# Altium footprint library hphonglib.PcbLib: 1250 footprints (part 63 of 79)
Each footprint in its own frame and in the unit in brackets; x right, y up, seen from the top. Pads: shape width x height; smd on the part's side, far side on the other; paste and mask are expansions set on the pad; w line width, h text height; cw(c..) or ccw(c..) is an arc to the next point about the centre after c.
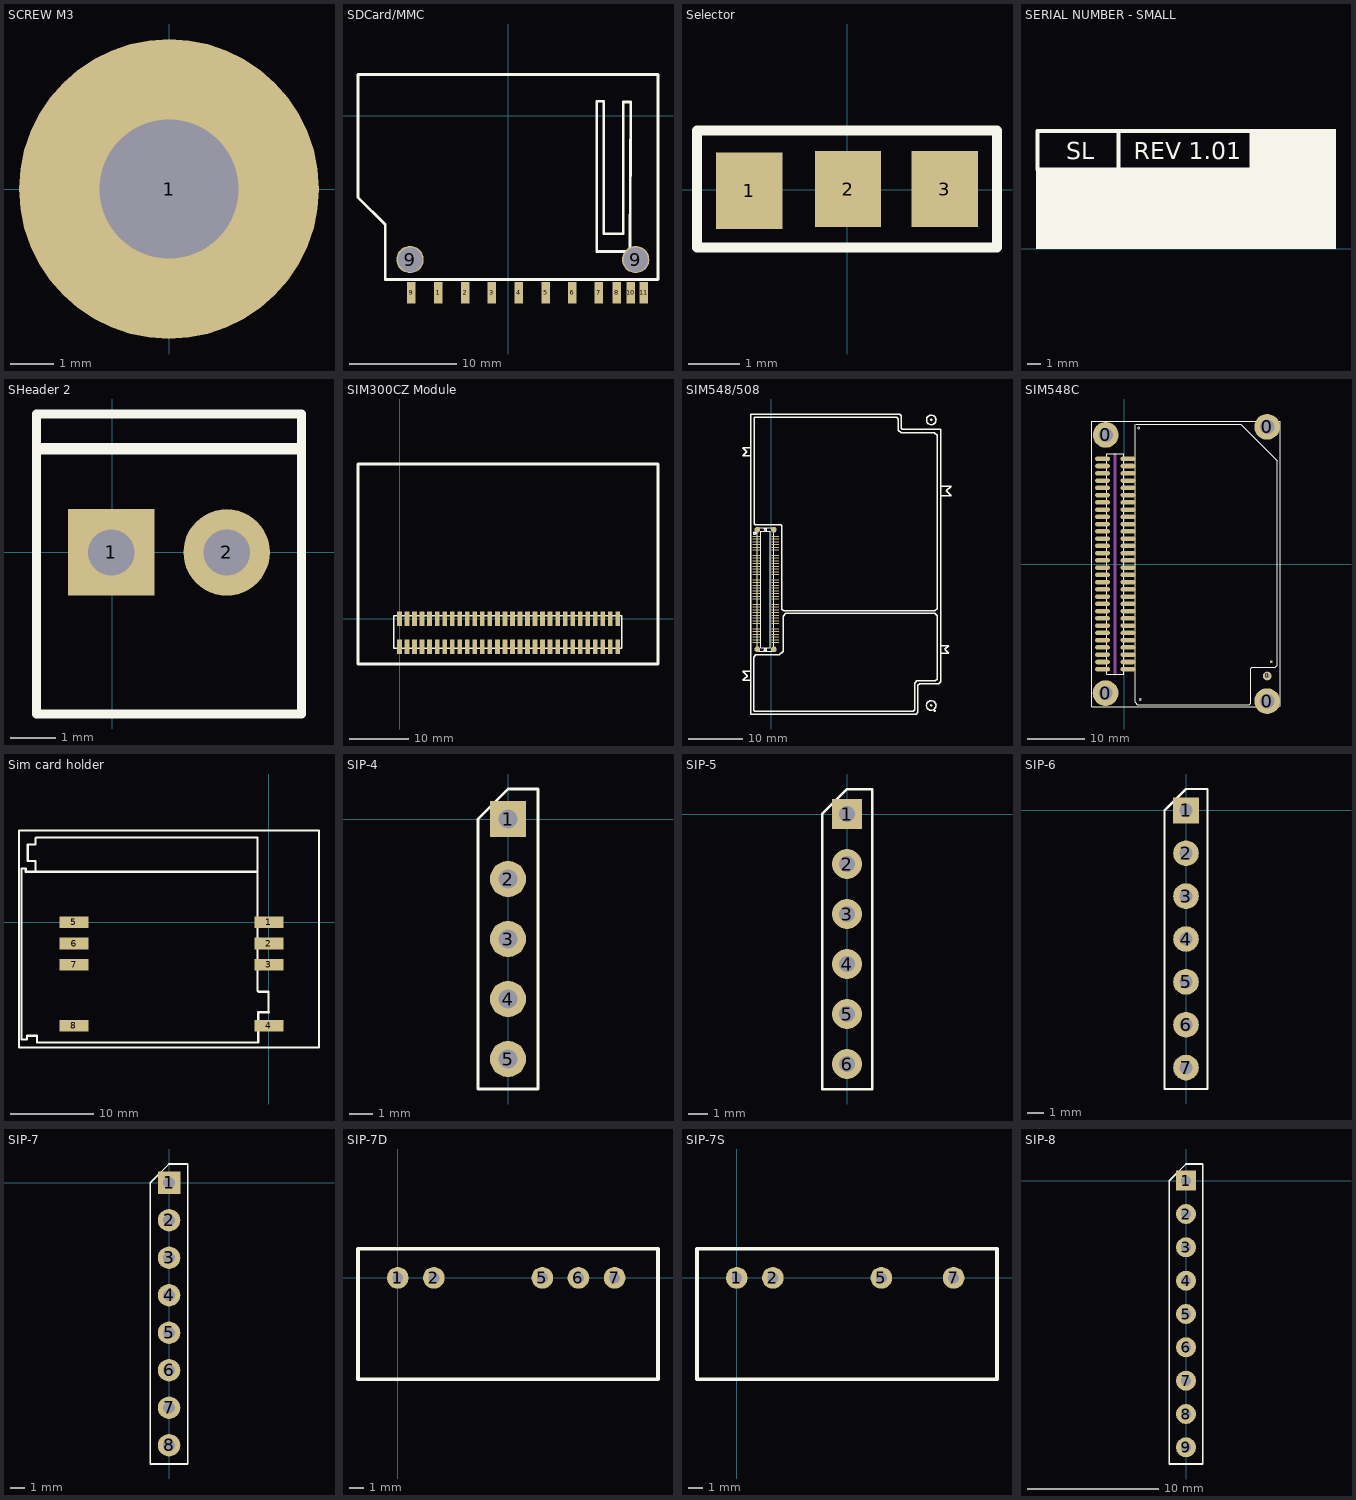
[diagram p62: the footprints below, top view; thin cyan lines are the x and y axes]

## SCREW M3 [mil] "Hole Screw"
pads (1):
  round 270 hole 125: 1(0,0)

## SDCard/MMC [mil]
pads (13):
  rect 31x79 smd: 1(-256,-650) 2(-157,-650) 3(-59,-650) 4(39,-650) 5(138,-650) 6(236,-650) 7(332,-650) 8(399,-650) 9(-354,-650) 10(450,-650) 11(497,-650)
  round 100 hole 90: 9(-359,-528) 9(468,-528)
Top Overlay:
  lines w10: -548,151 -550,151 ; -550,151 -118,151 550,151 550,-601 -447,-601 -450,-601 -450,-399 -550,-300 -550,151 ; 325,-498 337,-498 447,-498 450,50 423,50 423,-433 351,-433 351,53 325,53 325,-498

## Selector [mm]
pads (3):
  rect 1.3x1.5 smd: 1(-1.921,-0.018) 2(0.021,0.018) 3(1.921,0.018)
Top Overlay:
  lines w0.2: -2.946,1.157 -2.946,-1.132 2.915,-1.132 ; -2.946,1.168 2.94,1.168 ; 2.946,-1.132 2.946,1.168

## SERIAL NUMBER - SMALL [mm]
Top Overlay:
  rectangle: 19.052,-0.01 25.402,9.007
  rectangle: 2.807,-0.01 19.19,6.117
  lines w0.3: 9.019,5.959 9.019,8.88 ; 2.923,5.959 19.052,5.959 19.052,8.88 2.923,8.88 2.923,5.959
  text "REV 1.01" at 10.162,6.721 h1.3
  text "SL" at 5.082,6.721 h1.3

## SHeader 2 [mil] "Connector; Header; Signal; 2 Positions; Solder Pad 35mil"
pads (2):
  rect 75x75 hole 40: 1(-1,0)
  round 75 hole 40: 2(99,0)
Top Overlay:
  lines w7.87: -66,-140 -66,120 164,120 164,-140 -66,-140
  lines w10: -61,90 159,90

## SIM300CZ Module [mm] "GSM Module"
pads (60):
  rect 0.8x2.4 smd: 1(0,-4.7) 2(0,0) 3(1.27,-4.7) 4(1.27,0) 5(2.54,-4.7) 6(2.54,0) 7(3.81,-4.7) 8(3.81,0) 9(5.08,-4.7) 10(5.08,0) 11(6.35,-4.7) 12(6.35,0) 13(7.62,-4.7) 14(7.62,0) 15(8.89,-4.7) 16(8.89,0) 17(10.16,-4.7) 18(10.16,0) 19(11.43,-4.7) 20(11.43,0) 21(12.7,-4.7) 22(12.7,0) 23(13.97,-4.7) 24(13.97,0) 25(15.24,-4.7) 26(15.24,0) 27(16.51,-4.7) 28(16.51,0) 29(17.78,-4.7) 30(17.78,0) 31(19.05,-4.7) 32(19.05,0) 33(20.32,-4.7) 34(20.32,0) 35(21.59,-4.7) 36(21.59,0) 37(22.86,-4.7) 38(22.86,0) 39(24.13,-4.7) 40(24.13,0) 41(25.4,-4.7) 42(25.4,0) 43(26.67,-4.7) 44(26.67,0) 45(27.94,-4.7) 46(27.94,0) 47(29.21,-4.7) 48(29.21,0) 49(30.48,-4.7) 50(30.48,0) 51(31.75,-4.7) 52(31.75,0) 53(33.02,-4.7) 54(33.02,0) 55(34.29,-4.7) 56(34.29,0) 57(35.56,-4.7) 58(35.56,0) 59(36.83,-4.7) 60(36.83,0)
Top Overlay:
  lines w0.254: -1,-5 37.5,-5 37.5,0.5 -1,0.5 -1,-5
  lines w0.508: 5.3,26.1 8.9,26.1 ; 8.9,26.1 43.6,26.1 43.6,-7.6 22.3,-7.6 -1.9,-7.6 -7,-7.6 -7,26.1 8.9,26.1
3D body: height 4.01, standoff 3.9, extent 36.33,-3.762 37.33,-2.7
3D body: height 4.01, standoff 3.9, extent 36.33,-2 37.33,-0.938
3D body: height 4.01, standoff 3.9, extent 35.06,-2 36.06,-0.938
3D body: height 4.01, standoff 3.9, extent 35.06,-3.762 36.06,-2.7
3D body: height 4.01, standoff 3.9, extent 33.79,-2 34.79,-0.938
3D body: height 4.01, standoff 3.9, extent 33.79,-3.762 34.79,-2.7
3D body: height 4.01, standoff 3.9, extent 32.52,-3.762 33.52,-2.7
3D body: height 4.01, standoff 3.9, extent 32.52,-2 33.52,-0.938
3D body: height 4.01, standoff 3.9, extent 31.25,-2 32.25,-0.938
3D body: height 4.01, standoff 3.9, extent 31.25,-3.762 32.25,-2.7
3D body: height 4.01, standoff 3.9, extent 29.98,-2 30.98,-0.938
3D body: height 4.01, standoff 3.9, extent 29.98,-3.762 30.98,-2.7
3D body: height 4.01, standoff 3.9, extent 28.71,-3.762 29.71,-2.7
3D body: height 4.01, standoff 3.9, extent 28.71,-2 29.71,-0.938
3D body: height 4.01, standoff 3.9, extent 27.44,-2 28.44,-0.938
3D body: height 4.01, standoff 3.9, extent 27.44,-3.762 28.44,-2.7
3D body: height 4.01, standoff 3.9, extent 26.17,-2 27.17,-0.938
3D body: height 4.01, standoff 3.9, extent 26.17,-3.762 27.17,-2.7
3D body: height 4.01, standoff 3.9, extent 24.9,-3.762 25.9,-2.7
3D body: height 4.01, standoff 3.9, extent 24.9,-2 25.9,-0.938
3D body: height 4.01, standoff 3.9, extent 23.63,-2 24.63,-0.938
3D body: height 4.01, standoff 3.9, extent 23.63,-3.762 24.63,-2.7
3D body: height 4.01, standoff 3.9, extent 22.36,-2 23.36,-0.938
3D body: height 4.01, standoff 3.9, extent 22.36,-3.762 23.36,-2.7
3D body: height 4.01, standoff 3.9, extent 21.09,-3.762 22.09,-2.7
3D body: height 4.01, standoff 3.9, extent 21.09,-2 22.09,-0.938
3D body: height 4.01, standoff 3.9, extent 19.82,-2 20.82,-0.938
3D body: height 4.01, standoff 3.9, extent 19.82,-3.762 20.82,-2.7
3D body: height 4.01, standoff 3.9, extent 18.55,-2 19.55,-0.938
3D body: height 4.01, standoff 3.9, extent 18.55,-3.762 19.55,-2.7
3D body: height 4.01, standoff 3.9, extent 17.28,-3.762 18.28,-2.7
3D body: height 4.01, standoff 3.9, extent 17.28,-2 18.28,-0.938
3D body: height 4.01, standoff 3.9, extent 16.01,-2 17.01,-0.938
3D body: height 4.01, standoff 3.9, extent 16.01,-3.762 17.01,-2.7
3D body: height 4.01, standoff 3.9, extent 14.74,-2 15.74,-0.938
3D body: height 4.01, standoff 3.9, extent 14.74,-3.762 15.74,-2.7
3D body: height 4.01, standoff 3.9, extent 13.47,-3.762 14.47,-2.7
3D body: height 4.01, standoff 3.9, extent 13.47,-2 14.47,-0.938
3D body: height 4.01, standoff 3.9, extent 12.2,-2 13.2,-0.938
3D body: height 4.01, standoff 3.9, extent 12.2,-3.762 13.2,-2.7
3D body: height 4.01, standoff 3.9, extent 10.93,-2 11.93,-0.938
3D body: height 4.01, standoff 3.9, extent 10.93,-3.762 11.93,-2.7
3D body: height 4.01, standoff 3.9, extent 9.66,-3.762 10.66,-2.7
3D body: height 4.01, standoff 3.9, extent 9.66,-2 10.66,-0.938
3D body: height 4.01, standoff 3.9, extent 8.39,-2 9.39,-0.938
3D body: height 4.01, standoff 3.9, extent 8.39,-3.762 9.39,-2.7
3D body: height 4.01, standoff 3.9, extent 7.12,-2 8.12,-0.938
3D body: height 4.01, standoff 3.9, extent 7.12,-3.762 8.12,-2.7
3D body: height 4.01, standoff 3.9, extent 5.85,-3.762 6.85,-2.7
3D body: height 4.01, standoff 3.9, extent 5.85,-2 6.85,-0.938
3D body: height 4.01, standoff 3.9, extent -0.5,-2 0.5,-0.938
3D body: height 4, standoff 0.1, extent -0.9,-4.975 37.55,0.5
3D body: height 4.01, standoff 3.9, extent -0.5,-3.762 0.5,-2.7
3D body: height 4.01, standoff 3.9, extent 0.77,-3.762 1.77,-2.7
3D body: height 4.01, standoff 3.9, extent 0.77,-2 1.77,-0.938
3D body: height 4.01, standoff 3.9, extent 2.04,-3.762 3.04,-2.7
3D body: height 4.01, standoff 3.9, extent 2.04,-2 3.04,-0.938
3D body: height 4.01, standoff 3.9, extent 3.31,-3.762 4.31,-2.7
3D body: height 4.01, standoff 3.9, extent 3.31,-2 4.31,-0.938
3D body: height 4.01, standoff 3.9, extent 4.58,-3.762 5.58,-2.7
3D body: height 4.01, standoff 3.9, extent 4.58,-2 5.58,-0.938

## SIM548/508 [mm] "SIM508/548-80PIN"
pads (84):
  oct 1x1 smd: 0(-2.5,96) 0(-2.5,118) 0(0.5,96) 0(0.5,118)
  oct 1.4x0.17 smd: 1(-2.75,116.75) 2(0.75,116.75) 3(-2.75,116.25) 4(0.75,116.25) 5(-2.75,115.75) 6(0.75,115.75) 7(-2.75,115.25) 8(0.75,115.25) 9(-2.75,114.75) 10(0.75,114.75) 11(-2.75,114.25) 12(0.75,114.25) 13(-2.75,113.75) 14(0.75,113.75) 15(-2.75,113.25) 16(0.75,113.25) 17(-2.75,112.75) 18(0.75,112.75) 19(-2.75,112.25) 20(0.75,112.25) 21(-2.75,111.75) 22(0.75,111.75) 23(-2.75,111.25) 24(0.75,111.25) 25(-2.75,110.75) 26(0.75,110.75) 27(-2.75,110.25) 28(0.75,110.25) 29(-2.75,109.75) 30(0.75,109.75) 31(-2.75,109.25) 32(0.75,109.25) 33(-2.75,108.75) 34(0.75,108.75) 35(-2.75,108.25) 36(0.75,108.25) 37(-2.75,107.75) 38(0.75,107.75) 39(-2.75,107.25) 40(0.75,107.25) 41(-2.75,106.75) 42(0.75,106.75) 43(-2.75,106.25) 44(0.75,106.25) 45(-2.75,105.75) 46(0.75,105.75) 47(-2.75,105.25) 48(0.75,105.25) 49(-2.75,104.75) 50(0.75,104.75) 51(-2.75,104.25) 52(0.75,104.25) 53(-2.75,103.75) 54(0.75,103.75) 55(-2.75,103.25) 56(0.75,103.25) 57(-2.75,102.75) 58(0.75,102.75) 59(-2.75,102.25) 60(0.75,102.25) 61(-2.75,101.75) 62(0.75,101.75) 63(-2.75,101.25) 64(0.75,101.25) 65(-2.75,100.75) 66(0.75,100.75) 67(-2.75,100.25) 68(0.75,100.25) 69(-2.75,99.75) 70(0.75,99.75) 71(-2.75,99.25) 72(0.75,99.25) 73(-2.75,98.75) 74(0.75,98.75) 75(-2.75,98.25) 76(0.75,98.25) 77(-2.75,97.75) 78(0.75,97.75) 79(-2.75,97.25) 80(0.75,97.25)
Top Overlay:
  circle w0.254: c-3.014,117.35 r0.204
  circle w0.254: c29.424,85.7 r0.876
  circle w0.254: c29.434,138.15 r0.876
  circle w0.254: c29.42,138.21 r0.1
  circle w0.254: c29.4,85.7 r0.1
  circle w0.254: c30.1,84.7 r0.1
  rectangle: -1.25,118 -0.75,118.31
  rectangle: -1.245,95.681 -0.745,96.005
  lines w0.05: -1.25,118.086 -1.25,118.31 ; -1.25,118.105 ccw(c-1,118.105) -0.75,118.105 -0.75,118.3 ; -1.246,95.705 -1.246,95.9 cw(c-0.996,95.9) -0.746,95.9 -0.746,95.676
  lines w0.17: -2.5,95.625 -2.5,118.375 0.5,118.375 0.5,95.625 -2.5,95.625 ; -1.85,96.325 -0.15,96.325 -0.15,117.675 -1.85,117.675 -1.85,96.325
  lines w0.254: -3.72,90.3 -5.2,90.3 -5,90.5 -4.9,90.6 -4.4,91.1 -4.4,91.2 -5.2,92 -3.7,92 ; -3.72,131.6 -5.2,131.6 -4.5,132.3 ; -3.72,133 -5.2,133 -4.5,132.3 ; 2.2,102 2.2,102.1 ; 31.17,95.3 32.6,95.3 31.9,96 ; 31.17,96.7 32.6,96.7 31.9,96 ; 31.17,124.2 33.1,124.2 32.2,125.1 ; 31.17,126 33.1,126 32.2,125.1 ; -4.5,132.3 -4.5,132.3 ; 2.2,102.1 2.7,102.6 30.1,102.6 30.5,102.2 30.5,90.5 30.2,90.2 26.8,90.2 26.4,89.8 26.4,84.9 26.1,84.6 -3,84.6 -3.2,84.8 -3.2,94.6 -2.8,95 1.5,95 2.2,95.7 2.2,102.1 ; 31.9,96 31.9,96 ; 32.2,125.1 32.2,125.1 ; -3.72,84.13 26.63,84.13 26.97,84.47 26.97,89.37 27.3,89.7 30.8,89.7 31.17,90.07 31.17,97.42 31.17,136.4 31.14,136.43 24.13,136.43 23.94,136.62 23.94,137.1 23.94,138.96 23.66,139.24 -3.72,139.24 -3.72,84.13 ; -3.1,119.1 -2.9,118.9 1.8,118.9 2,118.7 2,103.4 2.3,103.1 3,103.1 30.1,103.1 30.5,103.5 30.5,119.7 30.5,135.3 30,135.8 23.9,135.8 23.4,136.3 23.4,138.3 23.1,138.6 -3.1,138.6 -3.1,119.1
3D body: height 1.6, standoff 0, extent -2.575,95.545 0.575,118.46
3D body: height 0, standoff 0, extent -3.218,117.146 -2.811,117.554
3D body: height 1, standoff 0, extent 28.42,137.155 30.43,139.155
3D body: height 1, standoff 0, extent 28.43,84.7 30.44,86.7
3D body: height 1, standoff 0, extent 29.195,137.975 29.655,138.435
3D body: height 1, standoff 0, extent 29.17,85.47 29.63,85.93
3D body: height 1, standoff 0, extent 31.191,124.211 33.068,126.077
3D body: height 1, standoff 0, extent 31.192,95.333 32.554,96.719
3D body: height 1, standoff 0, extent -5.134,90.273 -3.75,92.031
3D body: height 1, standoff 0, extent -5.167,131.572 -3.77,133.027

## SIM548C [mm] "SIM548C-60PIN"
pads (68):
  round 4.5 hole 2.5: 0(-3.28,-22.59) 0(-3.25,22.59) 0(25,-24) 0(25,24)
  round 0.5 hole 0.3: 0(2.5,23.8) 0(2.8,-23.7) 0(25.7,-17.1)
  round 1.524 hole 0.762: 0(25,-19.6)
  oval 2.6x0.8 smd: 1(-3.81,18.415) 2(0.635,18.415) 3(-3.81,17.145) 4(0.635,17.145) 5(-3.81,15.875) 6(0.635,15.875) 7(-3.81,14.605) 8(0.635,14.605) 9(-3.81,13.335) 10(0.635,13.335) 11(-3.81,12.065) 12(0.635,12.065) 13(-3.81,10.795) 14(0.635,10.795) 15(-3.81,9.525) 16(0.635,9.525) 17(-3.81,8.255) 18(0.635,8.255) 19(-3.81,6.985) 20(0.635,6.985) 21(-3.81,5.715) 22(0.635,5.715) 23(-3.81,4.445) 24(0.635,4.445) 25(-3.81,3.175) 26(0.635,3.175) 27(-3.81,1.905) 28(0.635,1.905) 29(-3.81,0.635) 30(0.635,0.635) 31(-3.81,-0.635) 32(0.635,-0.635) 33(-3.81,-1.905) 34(0.635,-1.905) 35(-3.81,-3.175) 36(0.635,-3.175) 37(-3.81,-4.445) 38(0.635,-4.445) 39(-3.81,-5.715) 40(0.635,-5.715) 41(-3.81,-6.985) 42(0.635,-6.985) 43(-3.81,-8.255) 44(0.635,-8.255) 45(-3.81,-9.525) 46(0.635,-9.525) 47(-3.81,-10.795) 48(0.635,-10.795) 49(-3.81,-12.065) 50(0.635,-12.065) 51(-3.81,-13.335) 52(0.635,-13.335) 53(-3.81,-14.605) 54(0.635,-14.605) 55(-3.81,-15.875) 56(0.635,-15.875) 57(-3.81,-17.145) 58(0.635,-17.145) 59(-3.81,-18.415) 60(0.635,-18.415)
Top Overlay:
  lines w0.17: 1.9,24.5 1.9,-24.2 2.3,-24.6 21.9,-24.6 22.1,-24.4 22.1,-18.3 22.3,-18.1 26.4,-18.1 26.8,-17.7 26.8,18.1 20.4,24.5 2.1,24.5 ; -5.715,-25 -5.715,25 27.305,25 27.305,-24.765 27.07,-25 -5.715,-25 ; -3.095,-19.265 -3.095,19.265 -2.345,19.265 -0.845,19.265 -0.075,19.265 -0.075,-19.265 -3.095,-19.265
Mechanical 1:
  lines w0.508: -1.6,-19.3 -1.6,19.2
3D body: height 3.5, standoff 0, extent -2.6,4.1 -1.9,4.9
3D body: height 3.5, standoff 0, extent -2.6,5.3 -1.9,6.1
3D body: height 3.5, standoff 0, extent -2.6,6.6 -1.9,7.4
3D body: height 3.5, standoff 0, extent -2.6,2.8 -1.9,3.6
3D body: height 3.5, standoff 0, extent -2.6,1.5 -1.9,2.3
3D body: height 3.5, standoff 0, extent -2.6,0.3 -1.9,1.1
3D body: height 3.5, standoff 0, extent -2.6,-1.1 -1.9,-0.3
3D body: height 3.5, standoff 0, extent -2.6,-2.4 -1.9,-1.6
3D body: height 3.5, standoff 0, extent -2.6,-3.6 -1.9,-2.8
3D body: height 3.5, standoff 0, extent -2.6,-4.9 -1.9,-4.1
3D body: height 3.5, standoff 0, extent -2.65,-6.2 -1.95,-5.4
3D body: height 3.5, standoff 0, extent -2.6,-7.4 -1.9,-6.6
3D body: height 3.5, standoff 0, extent -2.6,-8.7 -1.9,-7.9
3D body: height 3.5, standoff 0, extent -2.6,-10 -1.9,-9.2
3D body: height 3.5, standoff 0, extent -2.6,-11.2 -1.9,-10.4
3D body: height 3.5, standoff 0, extent -2.6,-12.5 -1.9,-11.7
3D body: height 3.5, standoff 0, extent -2.6,-13.8 -1.9,-13
3D body: height 3.5, standoff 0, extent -2.6,-15 -1.9,-14.2
3D body: height 3.5, standoff 0, extent -2.6,-16.3 -1.9,-15.5
3D body: height 3.5, standoff 0, extent -2.6,-17.6 -1.9,-16.8
3D body: height 3.5, standoff 0, extent -2.6,-18.8 -1.9,-18
3D body: height 3.5, standoff 0, extent -1.3,-16.3 -0.6,-15.5
3D body: height 3.5, standoff 0, extent -1.3,-17.6 -0.6,-16.8
3D body: height 3.5, standoff 0, extent -1.3,-18.8 -0.6,-18
3D body: height 3.5, standoff 0, extent -1.3,-12.5 -0.6,-11.7
3D body: height 3.5, standoff 0, extent -1.3,-13.8 -0.6,-13
3D body: height 3.5, standoff 0, extent -1.3,-15 -0.6,-14.2
3D body: height 3.5, standoff 0, extent -1.3,-8.7 -0.6,-7.9
3D body: height 3.5, standoff 0, extent -1.3,-10 -0.6,-9.2
3D body: height 3.5, standoff 0, extent -1.3,-11.2 -0.6,-10.4
3D body: height 3.5, standoff 0, extent -1.3,-4.9 -0.6,-4.1
3D body: height 3.5, standoff 0, extent -1.3,-6.2 -0.6,-5.4
3D body: height 3.5, standoff 0, extent -1.3,-7.4 -0.6,-6.6
3D body: height 3.5, standoff 0, extent -1.3,-1.1 -0.6,-0.3
3D body: height 3.5, standoff 0, extent -1.3,-2.4 -0.6,-1.6
3D body: height 3.5, standoff 0, extent -1.3,-3.6 -0.6,-2.8
3D body: height 3.5, standoff 0, extent -1.3,2.8 -0.6,3.6
3D body: height 3.5, standoff 0, extent -1.3,1.5 -0.6,2.3
3D body: height 3.5, standoff 0, extent -1.3,0.3 -0.6,1.1
3D body: height 3.5, standoff 0, extent -1.3,6.6 -0.6,7.4
3D body: height 3.5, standoff 0, extent -1.3,5.3 -0.6,6.1
3D body: height 3.5, standoff 0, extent -1.3,4.1 -0.6,4.9
3D body: height 3.5, standoff 0, extent -1.3,10.4 -0.6,11.2
3D body: height 3.5, standoff 0, extent -1.3,9.1 -0.6,9.9
3D body: height 3.5, standoff 0, extent -1.3,7.9 -0.6,8.7
3D body: height 3.5, standoff 0, extent -1.3,11.7 -0.6,12.5
3D body: height 3.5, standoff 0, extent -1.3,12.9 -0.6,13.7
3D body: height 3.5, standoff 0, extent -1.3,14.2 -0.6,15
3D body: height 3.5, standoff 0, extent -1.3,15.5 -0.6,16.3
3D body: height 3.5, standoff 0, extent -1.3,16.7 -0.6,17.5
3D body: height 3.5, standoff 0, extent -2.6,7.8 -1.9,8.6
3D body: height 3.5, standoff 0, extent -2.6,9.1 -1.9,9.9
3D body: height 3.5, standoff 0, extent -2.6,10.4 -1.9,11.2
3D body: height 3.5, standoff 0, extent -2.6,11.7 -1.9,12.5
3D body: height 3.5, standoff 0, extent -2.6,12.9 -1.9,13.7
3D body: height 3.5, standoff 0, extent -2.6,14.2 -1.9,15
3D body: height 3.5, standoff 0, extent -2.6,15.5 -1.9,16.3
3D body: height 3.5, standoff 0, extent -2.6,16.7 -1.9,17.5
3D body: height 3.5, standoff 0, extent -2.6,18 -1.9,18.8
3D body: height 3.5, standoff 0, extent -1.3,18 -0.6,18.8
3D body: height 3.5, standoff 0, extent -3.1,-19.3 -0.1,19.2

## Sim card holder [mm]
pads (8):
  rect 3.5x1.4 smd: 1(0,0) 2(0,-2.54) 3(0,-5.08) 4(0,-12.4) 5(-23.4,0) 6(-23.4,-2.54) 7(-23.4,-5.08) 8(-23.4,-12.4)
Top Overlay:
  lines w0.254: -29.718,-14.072 -29.718,-12.395 ; -29.718,-12.522 -29.718,6.452 -29.185,6.452 -29.185,6.071 -28.016,6.071 -28.016,7.366 -28.956,7.366 -28.956,9.322 -28.042,9.322 -28.042,10.058 -27.94,10.16 -1.397,10.16 -1.397,6.071 -27.965,6.071 ; -29.667,-14.072 -29.058,-14.072 -29.032,-14.046 -29.032,-13.614 -27.864,-13.614 ; -27.838,-13.64 -27.838,-14.427 -1.295,-14.427 -1.295,-10.795 -0.025,-10.795 -0.051,-10.77 -0.051,-8.306 -0.076,-8.331 -1.27,-8.331 -1.397,-8.204 -1.397,6.045 ; -24.9,-15 4,-15 5,-15 6,-15 6,5 6,10 6,11 -30,11 -30,5 -30,-15 -29,-15 -28,-15 -24,-15
3D body "SIMLOCK-1.STEP": height 2.5, standoff 0, extent -24.92,-9.895 5.08,7.405

## SIP-4 [mil]
pads (5):
  rect 60x60 hole 31.49 unplated: 1(0,0)
  round 60 hole 31.49 unplated: 2(0,-100) 3(0,-200) 4(0,-300) 5(0,-400)
Top Overlay:
  lines w5: -50,-450 50,-450 50,50 0,50 -50,0 -50,-450

## SIP-5 [mil]
pads (6):
  rect 60x60 hole 31.49 unplated: 1(0,0)
  round 60 hole 31.49 unplated: 2(0,-100) 3(0,-200) 4(0,-300) 5(0,-400) 6(0,-500)
Top Overlay:
  lines w5: -50,-550 50,-550 50,50 0,50 -50,0 -50,-550

## SIP-6 [mil]
pads (7):
  rect 60x60 hole 31.49 unplated: 1(0,0)
  round 60 hole 31.49 unplated: 2(0,-100) 3(0,-200) 4(0,-300) 5(0,-400) 6(0,-500) 7(0,-600)
Top Overlay:
  lines w5: -50,-650 50,-650 50,50 0,50 -50,0 -50,-650

## SIP-7 [mil]
pads (8):
  rect 60x60 hole 31.49 unplated: 1(0,0)
  round 60 hole 31.49 unplated: 2(0,-100) 3(0,-200) 4(0,-300) 5(0,-400) 6(0,-500) 7(0,-600) 8(0,-700)
Top Overlay:
  lines w5: -50,-750 -50,0 0,50 50,50 50,-750 -50,-750

## SIP-7D [mil] "Industry Standard SIP-7 Dual"
pads (5):
  round 60 hole 30: 1(0,0) 2(100,0) 5(400,0) 6(500,0) 7(600,0)
Top Overlay:
  lines w10: -110,-280 -110,80 720,80 720,-280 -110,-280

## SIP-7S [mil] "Industry Standard SIP-7 Single"
pads (4):
  round 60 hole 30: 1(0,0) 2(100,0) 5(400,0) 7(600,0)
Top Overlay:
  lines w10: -110,-280 -110,80 720,80 720,-280 -110,-280

## SIP-8 [mil]
pads (9):
  rect 60x60 hole 31.49 unplated: 1(0,0)
  round 60 hole 31.49 unplated: 2(0,-100) 3(0,-200) 4(0,-300) 5(0,-400) 6(0,-500) 7(0,-600) 8(0,-700) 9(0,-800)
Top Overlay:
  lines w5: -50,-850 50,-850 50,50 0,50 -50,0 -50,-850